# Altium footprint library mobinbyn-Socket.PcbLib: 131 footprints (part 1 of 9)
Each footprint in its own frame and in the unit in brackets; x right, y up, seen from the top. Pads: shape width x height; smd on the part's side, far side on the other; paste and mask are expansions set on the pad; w line width, h text height; cw(c..) or ccw(c..) is an arc to the next point about the centre after c.
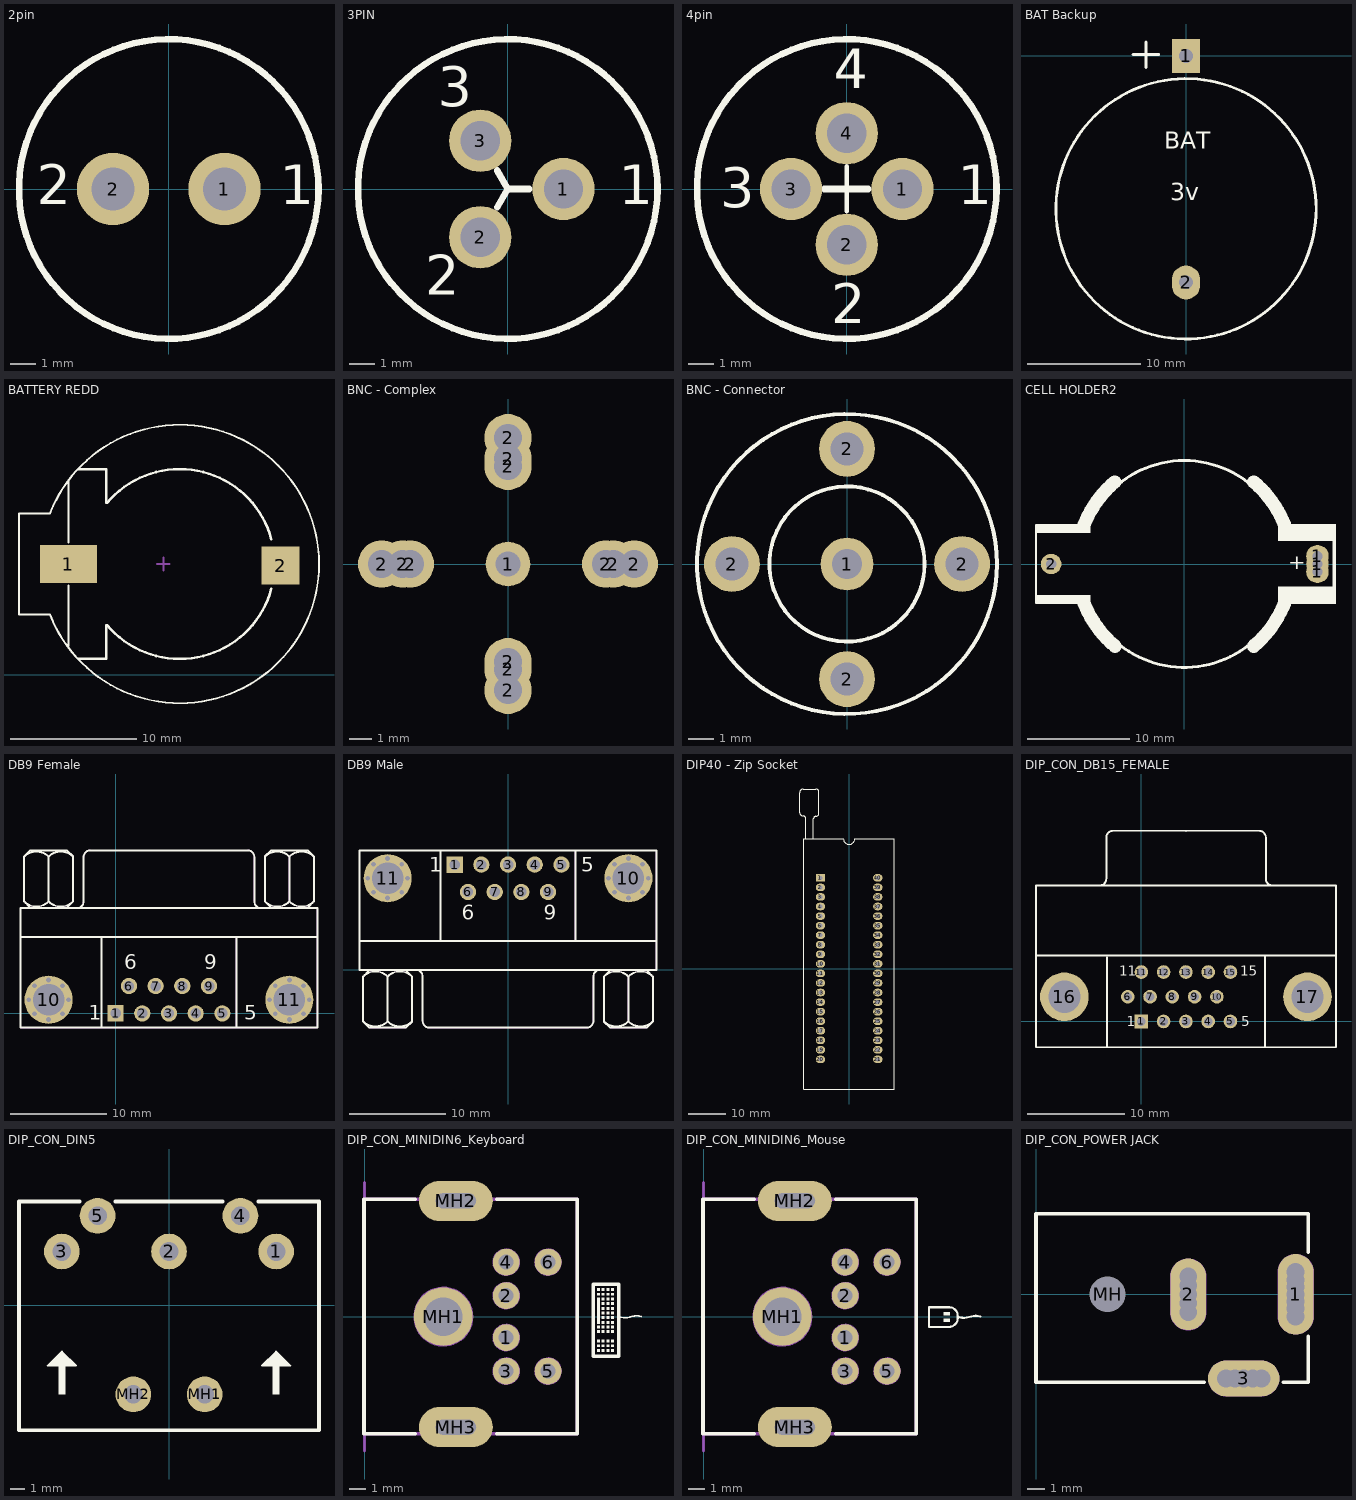
[diagram p0: the footprints below, top view; thin cyan lines are the x and y axes]

## 2pin [mil]
pads (2):
  round 110 hole 65: 1(85,0) 2(-85,0)
Top Overlay:
  circle w10: c0,0 r228.35
  text "1" at 169.11,-23.62 h60
  text "2" at -200.97,-23.62 h60
3D body "2PIN1.STEP": height 653.54, standoff -86.61, extent -297.24,-297.24 297.25,297.25

## 3PIN [mil]
pads (3):
  round 95 hole 60: 1(85,0) 2(-42,-73.49) 3(-42,73.49)
Top Overlay:
  circle w10: c0,0 r228.35
  lines w10: -16.25,28.43 0,0 ; -16,-28 0,0 ; 33,0 0,0
  text "1" at 169.11,-23.62 h60
  text "2" at -126.17,-161.42 h60
  text "3" at -106.48,125.98 h60
3D body "3pin1.STEP": height 653.54, standoff -86.61, extent -408.01,-408.01 404.08,404.08

## 4pin [mil]
pads (4):
  round 95 hole 60: 1(85,0) 2(0,-85) 3(-85,0) 4(0,85)
Top Overlay:
  circle w10: c0,0 r228.35
  lines w7: 0,-34 0,35
  lines w10: -34,0 33,0
  text "1" at 169.11,-23.62 h60
  text "4" at -19.87,153.54 h60
  text "3" at -193.09,-27.56 h60
  text "2" at -23.8,-204.72 h60
3D body "4PIN1.STEP": height 653.54, standoff -86.61, extent -420.36,-420.37 420.37,420.37

## BAT Backup [mm]
pads (2):
  rect 2.5x3 hole 1.2: 1(0,0)
  oval 2.5x3 hole 1.2: 2(0,-20)
Top Overlay:
  circle w0.254: c0,-13.5 r11.5
  lines w0.254: -4.67,0.14 -2.41,0.14 ; -3.52,-1.01 -3.52,1.25
  text "3v" at -1.405,-12.75 h1.52
  text "BAT" at -1.905,-8.18 h1.52
3D body "User Library-20mm_coin_holder.STEP": height 9.17, standoff -3, extent -11.5,-24.716 11.5,2.716

## BATTERY REDD [mm] "CELL BATTERY HOLDER 1220 12mm CR1220"
pads (2):
  rect 4.5x3 smd: 1(9.144,8.763)
  rect 3x3 smd: 2(25.908,8.636)
Top Overlay:
  lines w0.15: 7.675,12.763 5.237,12.763 5.237,4.763 7.683,4.763 ; 7.689,4.765 ccw(c17.937,8.763) 7.688,12.758 ; 9.137,2.263 9.137,7.063 ; 9.137,10.463 9.137,15.363
  lines w0.2: 9.937,1.263 12.137,1.263 12.137,3.942 ; 9.937,16.263 12.137,16.263 12.137,13.584 ; 12.192,3.942 ccw(c17.937,8.763) 25.181,6.822 ; 12.192,13.584 cw(c17.937,8.763) 25.181,10.704
Mechanical 15:
  lines w0.15: 16.137,8.763 17.137,8.763 ; 16.637,8.263 16.637,9.263
3D body "User Library-Battery Holder for CR1220 SMD.step": height 4.28, standoff -0.47, extent 8.177,1.374 26.978,16.123

## BNC - Complex [mil]
pads (13):
  round 80 hole 45: 1(0,0)
  round 85 hole 50: 2(-226.38,0) 2(-188.98,0) 2(-175.2,0) 2(0,-226.38) 2(0,-188.98) 2(0,-175.2) 2(0,175.2) 2(0,188.98) 2(0,226.38) 2(175.2,0) 2(188.98,0) 2(226.38,0)
3D body "BNC_complex.STEP": height 1369.68, standoff -173.23, extent -277.99,-278.2 278.01,278.21

## BNC - Connector [mil]
pads (5):
  round 80 hole 45: 1(0,0)
  round 85 hole 50: 2(-175.2,0) 2(0,-175.2) 2(0,175.2) 2(175.2,0)
Top Overlay:
  circle w5.91: c0,0 r228.35
  circle w5.91: c0,0 r118.11
3D body "My BNC Short.STEP": height 538.19, standoff -173.23, extent -218.11,-218.11 218.11,218.11

## CELL HOLDER2 [mm] "Battery Cell Holder"
height 5.5
pads (4):
  round 2.2 hole 1: 1(13,-0.762) 1(13,0) 1(13,0.762)
  round 2 hole 1: 2(-13,0)
Top Overlay:
  region: -14.478,3.899 -14.478,3.048 -9.144,3.048 -9.144,3.899
  region: -9.144,-3.902 -9.144,-3.048 -14.478,-3.048 -14.478,-3.902
  region: 14.808,-3.902 14.808,-2.21 9.144,-2.21 9.144,-3.902
  region: 9.144,3.899 9.144,2.235 14.808,2.235 14.808,3.899
  rectangle: 14.478,-3.877 14.808,3.898
  lines w0.2: -10.425,3.8 -14.478,3.8 -14.478,-3.8 -10.4,-3.8
  lines w0.3: -7.122,-7.161 ccw(c0,0) 7.122,-7.161 ; -6.534,7.701 cw(c0,0) 6.534,7.701
  lines w1.3: -9.801,-3.766 ccw(c0,0) -6.771,-8.025 ; -9.801,3.766 cw(c0,0) -6.793,8.006 ; 6.771,-8.025 ccw(c0,0) 9.801,-3.766 ; 6.793,8.006 cw(c0,0) 9.801,3.766
  text "+" at 10.16,-0.508 h1.5
3D body "CELL_HOLDER.STEP": height 5.4, standoff -2, extent -14.25,-9.999 14.25,9.999

## DB9 Female [mm] "Connector; D Subminiature AMPLIMITE 2000; 9 Position; Right Angle"
height 12.75
pads (27):
  rect 1.69x1.69 hole 1.09: 1(0,0)
  round 1.69 hole 1.09: 2(2.77,0) 3(5.54,0) 4(8.31,0) 5(11.08,0) 6(1.385,2.84) 7(4.155,2.84) 8(6.925,2.84) 9(9.695,2.84)
  round 0.8 hole 0.5: 10(-9.015,1.42) 10(-8.412,-0.037) 10(-8.412,2.877) 10(-6.955,-0.64) 10(-6.955,3.48) 10(-5.498,-0.037) 10(-5.498,2.877) 10(-4.895,1.42) 11(15.975,1.42) 11(16.578,-0.037) 11(16.578,2.877) 11(18.035,-0.64) 11(18.035,3.48) 11(19.492,-0.037) 11(19.492,2.877) 11(20.095,1.42)
  round 5 hole 3.26: 10(-6.955,1.42) 11(18.035,1.42)
Top Overlay:
  lines w0.2: -9.86,7.92 20.94,7.92 ; -9.498,16.27 -9.498,11.619 -8.863,10.984 ; -9.498,16.285 -8.863,16.92 -5.053,16.92 -4.418,16.285 ; -6.958,11.619 -6.958,16.27 ; -5.053,10.984 -4.418,11.619 -4.418,16.27 ; -4.418,15.006 -4.418,15.218 ; -4.02,10.925 ccw(c-4.02,11.62) -3.325,11.62 -3.325,16.22 ; -3.32,16.225 cw(c-2.625,16.225) -2.625,16.92 13.705,16.92 cw(c13.705,16.225) 14.4,16.225 ; -1.46,-1.48 -1.46,7.92 ; 12.54,-1.48 12.54,7.92 ; 14.405,16.22 14.405,11.62 ccw(c15.1,11.62) 15.1,10.925 ; 15.502,16.27 15.502,11.619 16.137,10.984 ; 15.502,16.285 16.137,16.92 19.947,16.92 20.582,16.285 ; 18.042,11.619 18.042,16.27 ; 19.947,10.984 20.582,11.619 20.582,16.27 ; 20.582,15.006 20.582,15.218 ; -9.86,-1.48 -9.86,10.92 20.94,10.92 20.94,-1.48 -9.86,-1.48
  lines w0.203: -9.5,11.617 ccw(c-8.228,12.889) -6.956,11.617 ; -9.498,16.27 cw(c-8.226,14.998) -6.953,16.27 ; -6.962,16.27 cw(c-5.69,14.998) -4.418,16.27 ; -6.96,11.617 ccw(c-5.688,12.889) -4.416,11.617 ; 15.5,11.617 ccw(c16.772,12.889) 18.044,11.617 ; 15.502,16.27 cw(c16.774,14.998) 18.047,16.27 ; 18.038,16.27 cw(c19.31,14.998) 20.582,16.27 ; 18.04,11.617 ccw(c19.312,12.889) 20.584,11.617
  text "1" at -2.794,-0.64 h1.5
  text "5" at 13.335,-0.64 h1.5
  text "9" at 9.2,4.6 h1.5
  text "6" at 0.9,4.6 h1.5
Mechanical 1:
  lines w0.1: -4.02,10.925 ccw(c-4.02,11.62) -3.325,11.62 ; -3.32,16.225 cw(c-2.625,16.225) -2.625,16.92 ; 13.705,16.92 cw(c13.705,16.225) 14.4,16.225 ; 14.405,11.62 ccw(c15.1,11.62) 15.1,10.925
Mechanical 13:
  lines w0.1: -9.86,7.92 20.94,7.92 ; -9.5,11.617 ccw(c-8.228,12.889) -6.956,11.617 ; -9.498,16.285 -8.863,16.92 -5.053,16.92 -4.418,16.285 ; -8.863,10.984 -9.498,11.619 -9.498,16.27 cw(c-8.226,14.998) -6.953,16.27 ; -6.962,16.27 cw(c-5.69,14.998) -4.418,16.27 -4.418,11.619 -5.053,10.984 ; -6.96,11.617 ccw(c-5.688,12.889) -4.416,11.617 ; -6.958,11.619 -6.958,16.27 ; -4.418,15.006 -4.418,15.218 ; -3.325,11.62 -3.325,16.22 ; -2.625,16.92 13.705,16.92 ; -1.46,-1.48 -1.46,7.92 ; 12.54,-1.48 12.54,7.92 ; 14.405,11.62 14.405,16.22 ; 15.5,11.617 ccw(c16.772,12.889) 18.044,11.617 ; 15.502,16.285 16.137,16.92 19.947,16.92 20.582,16.285 ; 16.137,10.984 15.502,11.619 15.502,16.27 cw(c16.774,14.998) 18.047,16.27 ; 18.038,16.27 cw(c19.31,14.998) 20.582,16.27 20.582,11.619 19.947,10.984 ; 18.04,11.617 ccw(c19.312,12.889) 20.584,11.617 ; 18.042,11.619 18.042,16.27 ; 20.582,15.006 20.582,15.218 ; -9.86,-1.48 -9.86,10.92 20.94,10.92 20.94,-1.48 -9.86,-1.48
3D body "SW3dPS-db9_socket.STEP": height 0.01, standoff -14.99, extent -10.888,13.746 22.112,87.015
3D body "9-PIN_DSUB-1.STEP": height 12.71, standoff -3.01, extent -9.865,-2.034 20.945,17.041

## DB9 Male [mm] "Connector; D Subminiature AMPLIMITE 2000; 9 Position; Right Angle"
height 12.75
pads (27):
  rect 1.69x1.69 hole 1.09: 1(-5.54,10.92)
  round 1.69 hole 1.09: 2(-2.77,10.92) 3(0,10.92) 4(2.77,10.92) 5(5.54,10.92) 6(-4.155,8.08) 7(-1.385,8.08) 8(1.385,8.08) 9(4.155,8.08)
  round 0.8 hole 0.5: 10(10.435,9.5) 10(11.038,8.043) 10(11.038,10.957) 10(12.495,7.44) 10(12.495,11.56) 10(13.952,8.043) 10(13.952,10.957) 10(14.555,9.5) 11(-14.555,9.5) 11(-13.952,8.043) 11(-13.952,10.957) 11(-12.495,7.44) 11(-12.495,11.56) 11(-11.038,8.043) 11(-11.038,10.957) 11(-10.435,9.5)
  round 5 hole 3.26: 10(12.495,9.5) 11(-12.495,9.5)
Top Overlay:
  lines w0.2: -15.4,3 15.4,3 ; -15.042,-5.365 -14.407,-6 -10.597,-6 -9.962,-5.365 ; -15.042,-5.35 -15.042,-0.699 -14.407,-0.064 ; -15.042,-4.298 -15.042,-4.086 ; -12.502,-5.35 -12.502,-0.699 ; -10.597,-0.064 -9.962,-0.699 -9.962,-5.35 ; -9.56,-0.005 cw(c-9.56,-0.7) -8.865,-0.7 -8.865,-5.3 ; -8.86,-5.305 ccw(c-8.165,-5.305) -8.165,-6 8.165,-6 ccw(c8.165,-5.305) 8.86,-5.305 ; -7,3 -7,12.4 ; 7,3 7,12.4 ; 8.865,-5.3 8.865,-0.7 cw(c9.56,-0.7) 9.56,-0.005 ; 9.958,-5.365 10.593,-6 14.403,-6 15.038,-5.365 ; 9.958,-5.35 9.958,-0.699 10.593,-0.064 ; 9.958,-4.298 9.958,-4.086 ; 12.498,-5.35 12.498,-0.699 ; 14.403,-0.064 15.038,-0.699 15.038,-5.35 ; -15.4,0 15.4,0 15.4,12.4 -15.4,12.4 -15.4,0
  lines w0.203: -15.044,-0.697 cw(c-13.772,-1.969) -12.5,-0.697 ; -15.042,-5.35 ccw(c-13.77,-4.078) -12.498,-5.35 ; -12.507,-5.35 ccw(c-11.234,-4.078) -9.962,-5.35 ; -12.504,-0.697 cw(c-11.232,-1.969) -9.96,-0.697 ; 9.956,-0.697 cw(c11.228,-1.969) 12.5,-0.697 ; 9.958,-5.35 ccw(c11.23,-4.078) 12.502,-5.35 ; 12.493,-5.35 ccw(c13.766,-4.078) 15.038,-5.35 ; 12.496,-0.697 cw(c13.768,-1.969) 15.04,-0.697
  text "9" at 3.7,5.2 h1.5
  text "5" at 7.6,10.2 h1.5
  text "1" at -8.165,10.2 h1.5
  text "6" at -4.8,5.2 h1.5
Mechanical 13:
  lines w0.1: -15.4,3 15.4,3 ; -15.044,-0.697 cw(c-13.772,-1.969) -12.5,-0.697 ; -15.042,-5.365 -14.407,-6 -10.597,-6 -9.962,-5.365 ; -15.042,-4.298 -15.042,-4.086 ; -14.407,-0.064 -15.042,-0.699 -15.042,-5.35 ccw(c-13.77,-4.078) -12.498,-5.35 ; -12.507,-5.35 ccw(c-11.234,-4.078) -9.962,-5.35 -9.962,-0.699 -10.597,-0.064 ; -12.504,-0.697 cw(c-11.232,-1.969) -9.96,-0.697 ; -12.502,-5.35 -12.502,-0.699 ; -9.56,-0.005 cw(c-9.56,-0.7) -8.865,-0.7 -8.865,-5.3 ; -8.86,-5.305 ccw(c-8.165,-5.305) -8.165,-6 8.165,-6 ccw(c8.165,-5.305) 8.86,-5.305 ; -7,3 -7,12.4 ; 7,3 7,12.4 ; 8.865,-5.3 8.865,-0.7 cw(c9.56,-0.7) 9.56,-0.005 ; 9.956,-0.697 cw(c11.228,-1.969) 12.5,-0.697 ; 9.958,-5.365 10.593,-6 14.403,-6 15.038,-5.365 ; 9.958,-4.298 9.958,-4.086 ; 10.593,-0.064 9.958,-0.699 9.958,-5.35 ccw(c11.23,-4.078) 12.502,-5.35 ; 12.493,-5.35 ccw(c13.766,-4.078) 15.038,-5.35 15.038,-0.699 14.403,-0.064 ; 12.496,-0.697 cw(c13.768,-1.969) 15.04,-0.697 ; 12.498,-5.35 12.498,-0.699 ; -15.4,0 15.4,0 15.4,12.4 -15.4,12.4 -15.4,0
3D body "9-PIN_DSUB.STEP": height 12.77, standoff -2.95, extent -15.483,-6.688 15.403,12.997

## DIP40 - Zip Socket [mm]
pads (40):
  rect 2.5x2 hole 1.1: 1(-7.62,24.13)
  oval 2.5x2 hole 1.1: 2(-7.62,21.59) 3(-7.62,19.05) 4(-7.62,16.51) 5(-7.62,13.97) 6(-7.62,11.43) 7(-7.62,8.89) 8(-7.62,6.35) 9(-7.62,3.81) 10(-7.62,1.27) 11(-7.62,-1.27) 12(-7.62,-3.81) 13(-7.62,-6.35) 14(-7.62,-8.89) 15(-7.62,-11.43) 16(-7.62,-13.97) 17(-7.62,-16.51) 18(-7.62,-19.05) 19(-7.62,-21.59) 20(-7.62,-24.13) 21(7.62,-24.13) 22(7.62,-21.59) 23(7.62,-19.05) 24(7.62,-16.51) 25(7.62,-13.97) 26(7.62,-11.43) 27(7.62,-8.89) 28(7.62,-6.35) 29(7.62,-3.81) 30(7.62,-1.27) 31(7.62,1.27) 32(7.62,3.81) 33(7.62,6.35) 34(7.62,8.89) 35(7.62,11.43) 36(7.62,13.97) 37(7.62,16.51) 38(7.62,19.05) 39(7.62,21.59) 40(7.62,24.13)
Top Overlay:
  lines w0.2: -11.557,34.5 -11.557,39.903 ccw(c-12.243,39.903) -12.243,40.589 cw(c-12.243,41.478) -13.132,41.478 -13.132,46.812 cw(c-12.198,46.812) -12.198,47.746 -8.808,47.746 cw(c-8.808,46.965) -8.026,46.965 -8.026,41.269 cw(c-8.808,41.269) -8.808,40.488 ccw(c-8.808,39.795) -9.5,39.795 -9.5,34.5 ; -12,-32 12,-32 12,34.5 1.5,34.5 cw(c0,34.5) -1.5,34.5 -12,34.5 -12,-32
3D body "Zif-Zip Socket.STEP": height 21.97, standoff -2.53, extent -12.975,-31.475 11.501,41.611

## DIP_CON_DB15_FEMALE [mm] "DB15 VGA connector"
height 14.5
pads (17):
  rect 1.4x1.4 hole 0.9: 1(0,0)
  round 1.4 hole 0.9: 2(2.29,0) 3(4.58,0) 4(6.87,0) 5(9.16,0) 6(-1.4,2.54) 7(0.89,2.54) 8(3.18,2.54) 9(5.47,2.54) 10(7.76,2.54) 11(0,5.08) 12(2.29,5.08) 13(4.58,5.08) 14(6.87,5.08) 15(9.16,5.08)
  round 5 hole 3.3: 16(-7.915,2.54) 17(17.075,2.54)
Top Overlay:
  lines w0.2: -10.83,6.77 20.01,6.77 ; -4.3,13.975 ccw(c-4.3,14.67) -3.605,14.67 -3.605,18.91 cw(c-2.91,18.91) -2.91,19.605 4.595,19.59 12.1,19.605 cw(c12.1,18.91) 12.795,18.91 12.795,14.67 ccw(c13.49,14.67) 13.49,13.975 ; -3.535,-2.65 -3.535,6.57 ; 12.725,-2.65 12.725,6.65 ; -10.83,-2.65 -10.83,13.97 20.01,13.97 20.01,-2.65 -10.83,-2.65
  text "15" at 10.16,4.699 h1
  text "5" at 10.287,-0.508 h1
  text "11" at -2.286,4.699 h1
  text "1" at -1.524,-0.508 h1
3D body "SW3dPS-vga connector.STEP": height 14.3, standoff -0.79, extent -12.145,27.686 21.543,72.816
3D body "DB15 Analog RGB.stp": height 12.75, standoff -3.75, extent -10.935,-1.672 20.065,20.828

## DIP_CON_DIN5 [mm]
height 21.5
pads (7):
  round 2.5 hole 1.3: 1(7.5,3.75) 2(0,3.75) 3(-7.5,3.75) 4(5,6.25) 5(-5,6.25) MH1(2.5,-6.25) MH2(-2.5,-6.25)
Top Overlay:
  region: 7.75,-4.25 7.25,-4.25 7.25,-6.25 7.75,-6.25
  rectangle: -7.75,-6.25 -7.25,-4.25
  region: 8.5,-4.25 7.5,-3.25 6.5,-4.25
  region: -8.5,-4.25 -7.5,-3.25 -6.5,-4.25
  lines w0.127: -8.5,-4.25 -6.5,-4.25 -7.5,-3.25 -8.5,-4.25 ; 6.5,-4.25 8.5,-4.25 7.5,-3.25 6.5,-4.25
  lines w0.254: -6.25,7.25 -10.5,7.25 -10.5,-8.75 10.5,-8.75 10.5,7.25 6.25,7.25 ; -3.75,7.25 3.75,7.25
3D body "5PINDIN.STEP": height 21.4, standoff -3.5, extent -10.34,-8.95 10.36,6.05
3D body "pin.stp": height 12.87, standoff -2.91, extent -5.72,5.087 -0.427,6.636
3D body: height 13.2, standoff 12, extent -0.89,4.62 -0.359,6.72
3D body: height 13.2, standoff 12, extent 0.39,4.64 0.921,6.74
3D body "pin.stp": height 12.87, standoff -2.91, extent 0.427,5.764 5.72,7.313

## DIP_CON_MINIDIN6_Keyboard [mm] "PS2 Conector-Keyboard"
height 13
pads (9):
  round 1.6 hole 0.9: 1(8.45,-1.25) 2(8.45,1.25) 3(8.45,-3.25) 4(8.45,3.25) 5(10.95,-3.25) 6(10.95,3.25)
  round 3.5 hole 2.3: MH1(4.7,0)
  oval 4.4x2.4 hole 0.9 slot 2.4 at 0 deg: MH2(5.45,6.905) MH3(5.45,-6.595)
Top Overlay:
  region: 13.873,1.143 13.873,-0.432 14.051,-0.432 14.051,1.143
  region: 13.873,-0.533 13.873,-0.711 14.051,-0.711 14.051,-0.533
  region: 14.711,-1.93 14.711,-2.108 14.889,-2.108 14.889,-1.93
  region: 14.711,-1.651 14.711,-1.829 14.889,-1.829 14.889,-1.651
  region: 14.711,-1.372 14.711,-1.549 14.889,-1.549 14.889,-1.372
  region: 14.711,-0.813 14.711,-0.991 14.889,-0.991 14.889,-0.813
  region: 14.711,-0.533 14.711,-0.711 14.889,-0.711 14.889,-0.533
  region: 14.711,-0.254 14.711,-0.432 14.889,-0.432 14.889,-0.254
  region: 14.711,0.025 14.711,-0.152 14.889,-0.152 14.889,0.025
  region: 14.711,0.305 14.711,0.127 14.889,0.127 14.889,0.305
  region: 14.711,0.584 14.711,0.406 14.889,0.406 14.889,0.584
  region: 14.711,0.864 14.711,0.686 14.889,0.686 14.889,0.864
  region: 14.711,1.143 14.711,0.965 14.889,0.965 14.889,1.143
  region: 14.711,1.422 14.711,1.245 14.889,1.245 14.889,1.422
  region: 14.432,-1.93 14.432,-2.108 14.61,-2.108 14.61,-1.93
  region: 14.432,-1.651 14.432,-1.829 14.61,-1.829 14.61,-1.651
  region: 14.432,-1.372 14.432,-1.549 14.61,-1.549 14.61,-1.372
  region: 14.432,-0.813 14.432,-0.991 14.61,-0.991 14.61,-0.813
  region: 14.432,-0.533 14.432,-0.711 14.61,-0.711 14.61,-0.533
  region: 14.432,-0.254 14.432,-0.432 14.61,-0.432 14.61,-0.254
  region: 14.432,0.025 14.432,-0.152 14.61,-0.152 14.61,0.025
  region: 14.432,0.305 14.432,0.127 14.61,0.127 14.61,0.305
  region: 14.432,0.584 14.432,0.406 14.61,0.406 14.61,0.584
  region: 14.432,0.864 14.432,0.686 14.61,0.686 14.61,0.864
  region: 14.432,1.143 14.432,0.965 14.61,0.965 14.61,1.143
  region: 14.432,1.422 14.432,1.245 14.61,1.245 14.61,1.422
  region: 14.152,-1.93 14.152,-2.108 14.33,-2.108 14.33,-1.93
  region: 14.152,-1.651 14.152,-1.829 14.33,-1.829 14.33,-1.651
  region: 14.152,-1.372 14.152,-1.549 14.33,-1.549 14.33,-1.372
  region: 14.152,-0.813 14.152,-0.991 14.33,-0.991 14.33,-0.813
  region: 14.152,-0.533 14.152,-0.711 14.33,-0.711 14.33,-0.533
  region: 14.152,-0.254 14.152,-0.432 14.33,-0.432 14.33,-0.254
  region: 14.152,0.025 14.152,-0.152 14.33,-0.152 14.33,0.025
  region: 14.152,0.305 14.152,0.127 14.33,0.127 14.33,0.305
  region: 14.152,0.584 14.152,0.406 14.33,0.406 14.33,0.584
  region: 14.152,0.864 14.152,0.686 14.33,0.686 14.33,0.864
  region: 14.152,1.143 14.152,0.965 14.33,0.965 14.33,1.143
  region: 14.152,1.422 14.152,1.245 14.33,1.245 14.33,1.422
  rectangle: 14.711,1.524 14.889,1.702
  rectangle: 14.432,1.524 14.61,1.702
  rectangle: 14.152,1.524 14.33,1.702
  region: 13.873,-1.93 13.873,-2.108 14.051,-2.108 14.051,-1.93
  region: 13.873,-1.651 13.873,-1.829 14.051,-1.829 14.051,-1.651
  region: 13.873,-1.372 13.873,-1.549 14.051,-1.549 14.051,-1.372
  region: 13.873,-0.813 13.873,-0.991 14.051,-0.991 14.051,-0.813
  region: 13.873,1.422 13.873,1.245 14.051,1.245 14.051,1.422
  region: 13.873,1.702 13.873,1.524 14.051,1.524 14.051,1.702
  lines w0.102: 15.168,0 ccw(c15.543,0.877) 15.839,-0.029 cw(c16.214,-0.907) 16.51,0
  lines w0.2: -0.05,-7 -0.05,7 ; 3.033,-7 0,-7 0,7 3.033,7 ; 7.889,-7 12.7,-7 12.7,7 7.889,7
  lines w0.203: 13.644,-2.362 15.168,-2.362 15.168,1.93 13.644,1.93 13.644,-2.362
Mechanical 7:
  circle w0.2: c4.7,0 r1.697
  circle w0.2: c8.45,3.25 r0.725
  circle w0.2: c8.45,1.25 r0.725
  circle w0.2: c8.45,-1.25 r0.725
  circle w0.2: c8.45,-3.25 r0.725
  circle w0.2: c10.95,-3.25 r0.725
  circle w0.2: c10.95,3.25 r0.725
  lines w0.2: 0,-8.001 0,-7 ; 0,8.001 0,7 ; 0,-7 0,7 ; 0,-7 0,7 ; -0.05,-7 -0.05,7 12.7,7 12.7,-7 -0.05,-7
  text "PCB Edge" at 1.143,-6.731 h0.8
3D body "Mini DIN - 6 Way - Purple.stp": height 13, standoff -3.2, extent -0.101,-7.025 12.698,6.975
3D body "kyassps2.stp": height 7.64, standoff -14.22, extent -101.497,-7.096 2.667,6.506

## DIP_CON_MINIDIN6_Mouse [mm] "PS2 Connector-Mouse"
height 13
pads (9):
  round 1.6 hole 0.9: 1(8.45,-1.25) 2(8.45,1.25) 3(8.45,-3.25) 4(8.45,3.25) 5(10.95,-3.25) 6(10.95,3.25)
  round 3.5 hole 2.3: MH1(4.7,0)
  oval 4.4x2.4 hole 0.9 slot 2.4 at 0 deg: MH2(5.45,6.905) MH3(5.45,-6.595)
Top Overlay:
  region: 14.711,-0.33 14.711,-0.102 14.305,-0.102 14.305,-0.33
  region: 14.305,0.279 14.305,0.051 14.711,0.051 14.711,0.279
  lines w0.127: 14.648,-0.61 ccw(c14.648,-0.089) 15.169,-0.089 15.169,0.025 ; 14.648,0.559 cw(c14.648,0.038) 15.169,0.038 ; 14.66,-0.61 13.441,-0.61 13.441,0.559 14.66,0.559 ; 15.168,0 ccw(c15.543,0.877) 15.839,-0.029 cw(c16.214,-0.907) 16.51,0
  lines w0.2: -0.05,-7 -0.05,7 ; 3.033,-7 0,-7 0,7 3.033,7 ; 7.889,-7 12.7,-7 12.7,7 7.889,7
Mechanical 7:
  circle w0.2: c4.7,0 r1.697
  circle w0.2: c8.45,3.25 r0.725
  circle w0.2: c8.45,1.25 r0.725
  circle w0.2: c8.45,-1.25 r0.725
  circle w0.2: c8.45,-3.25 r0.725
  circle w0.2: c10.95,-3.25 r0.725
  circle w0.2: c10.95,3.25 r0.725
  lines w0.2: 0,-8.001 0,-7 ; 0,8.001 0,7 ; 0,-7 0,7 ; 0,-7 0,7 ; -0.05,-7 -0.05,7 12.7,7 12.7,-7 -0.05,-7
  text "PCB Edge" at 1.143,-6.731 h0.8
3D body "ps2assy.stp": height 7.64, standoff -14.17, extent -99.846,-6.648 2.667,6.852
3D body "Mini DIN - 6 Way - Purple.stp": height 13, standoff -3.2, extent -0.101,-7.025 12.698,6.975

## DIP_CON_POWER JACK [mm] "Power Adaptor Jack"
height 11
pads (4):
  oval 2x4.5 hole 1: 1(14.5,0)
  oval 2x4 hole 1: 2(8.5,0)
  oval 4x2 hole 1: 3(11.6,-4.7)
  round 1.9 hole 2: MH(4,0)
via 14.5,1.25 diameter 1.5 hole 1
via 14.5,0.8 diameter 1.5 hole 1
via 14.5,0.4 diameter 1.5 hole 1
via 14.5,-0.4 diameter 1.5 hole 1
via 14.5,-0.8 diameter 1.5 hole 1
via 14.5,-1.25 diameter 1.5 hole 1
via 8.5,-1 diameter 1.5 hole 1
via 8.5,-0.5 diameter 1.5 hole 1
via 8.5,0.5 diameter 1.5 hole 1
via 8.5,1 diameter 1.5 hole 1
via 10.6,-4.7 diameter 1.5 hole 1
via 11.1,-4.7 diameter 1.5 hole 1
via 12.1,-4.7 diameter 1.5 hole 1
via 12.6,-4.7 diameter 1.5 hole 1
Top Overlay:
  lines w0.2: 9.4,-4.9 0,-4.9 0,4.5 15.2,4.5 15.2,2.35 ; 13.8,-4.9 15.2,-4.9 15.2,-2.35
Mechanical 1:
  lines w1: 8.5,-1 8.5,1 ; 10.6,-4.7 12.6,-4.7 ; 14.5,-1.25 14.5,1.25
Mechanical 2:
  lines w2.016: 8.5,-1 8.5,1 ; 10.6,-4.7 12.6,-4.7 ; 14.5,-1.25 14.5,1.25
3D body "SW3dPS-PowerJack-2.5x5.7mm.STEP": height 11, standoff -3.5, extent 0,-4.9 15.2,4.5